# Altium footprint library 20210518.PcbLib: 414 footprints (part 17 of 26)
Each footprint in its own frame and in the unit in brackets; x right, y up, seen from the top. Pads: shape width x height; smd on the part's side, far side on the other; paste and mask are expansions set on the pad; w line width, h text height; cw(c..) or ccw(c..) is an arc to the next point about the centre after c.
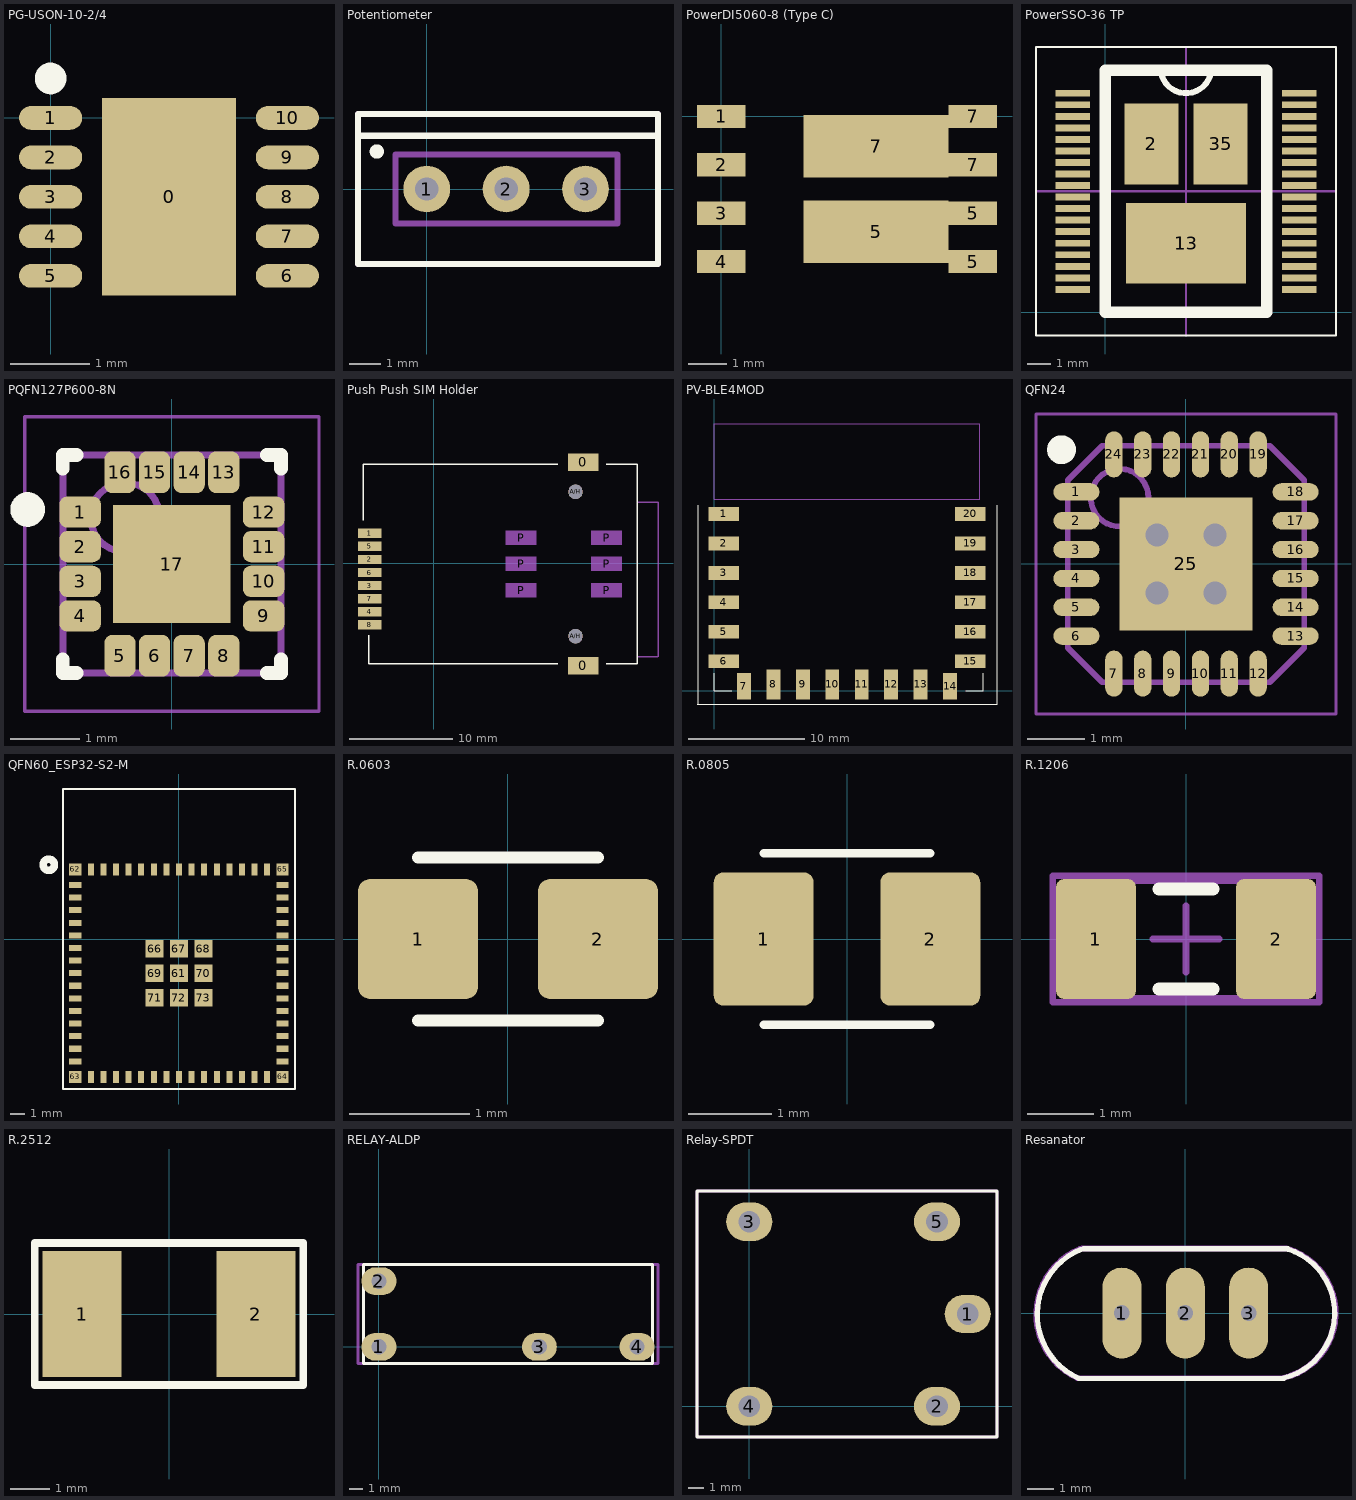
[diagram p16: the footprints below, top view; thin cyan lines are the x and y axes]

## PG-USON-10-2/4 [mm] "PG-USON-10-2,-4 Package Outline"
height 0.6
pads (11):
  rect 1.7x2.5 smd: 0(1.5,-1)
  oval 0.8x0.3 smd: 1(0,0) 2(0,-0.5) 3(0,-1) 4(0,-1.5) 5(0,-2) 6(3,-2) 7(3,-1.5) 8(3,-1) 9(3,-0.5) 10(3,0)
Top Overlay:
  circle w0.2: c0,0.5 r0.1
3D body: height 0.6, standoff 0, extent 0,-2.5 3,0.5

## Potentiometer [mm] "Bourns Potentiometer"
pads (3):
  round 1.5 hole 0.75: 1(0,0) 2(2.54,0) 3(5.08,0)
Top Overlay:
  circle w0.254: c-1.6,1.2 r0.1
  lines w0.2: -2.2,1.7 7.4,1.7 ; -2.2,-2.4 -2.2,2.4 7.4,2.4 7.4,-2.4 -2.2,-2.4
Mechanical 13:
  lines w0.2: -2.2,-2.4 -2.2,2.4 7.4,2.4 7.4,-2.4 -2.2,-2.4
Mechanical 15:
  lines w0.2: -1,-1.1 6.1,-1.1 6.1,1.1 -1,1.1 -1,-1.1
3D body: height 11.55, standoff -6.4, extent -2.3,-2.4 7.23,2.431

## PowerDI5060-8 (Type C) [mm] "6.15*5.15*1mm"
height 1.1
pads (10):
  rect 1.27x0.61 smd: 1(0,0) 2(0,-1.27) 3(0,-2.54) 4(0,-3.81) 5(6.61,-3.81) 5(6.61,-2.54) 7(6.61,-1.27) 7(6.61,0)
  rect 3.81x1.65 smd: 5(4.07,-3.03) 7(4.07,-0.78)

## PowerSSO-36 TP [mm] "ECOPACK"
height 2.5
pads (39):
  rect 1.5x0.3 smd: 1(-1.4,9.5) 2(-1.4,9) 3(-1.4,8.5) 4(-1.4,8) 5(-1.4,7.5) 6(-1.4,7) 7(-1.4,6.5) 8(-1.4,6) 9(-1.4,5.5) 10(-1.4,5) 11(-1.4,4.5) 12(-1.4,4) 13(-1.4,3.5) 14(-1.4,3) 15(-1.4,2.5) 16(-1.4,2) 17(-1.4,1.5) 18(-1.4,1) 19(8.4,1) 20(8.4,1.5) 21(8.4,2) 22(8.4,2.5) 23(8.4,3) 24(8.4,3.5) 25(8.4,4) 26(8.4,4.5) 27(8.4,5) 28(8.4,5.5) 29(8.4,6) 30(8.4,6.5) 31(8.4,7) 32(8.4,7.5) 33(8.4,8) 34(8.4,8.5) 35(8.4,9) 36(8.4,9.5)
  rect 2.35x3.5 smd: 2(2,7.3) 35(5,7.3)
  rect 5.2x3.5 smd: 13(3.5,3)
Top Overlay:
  lines w0.1: -3,-1 -3,11.5 10,11.5 10,-1 -3,-1
  lines w0.254: 2.466,10.224 ccw(c3.5,10.6) 4.534,10.224
  lines w0.5: 0,0 0,10.5 7,10.5 7,0 0,0
Mechanical 13:
  lines w0.1: -3,5.25 10,5.25 ; 3.5,-1 3.5,11.5
3D body: height 2.31, standoff -0.01, extent -1.694,0 8.806,10.5

## PQFN127P600-8N [mm]
height 1
pads (17):
  rrect50% 0.6x0.45 smd: 1(-1.325,0.75) 2(-1.325,0.25) 3(-1.325,-0.25) 4(-1.325,-0.75) 9(1.325,-0.75) 10(1.325,-0.25) 11(1.325,0.25) 12(1.325,0.75)
  rrect50% 0.45x0.6 smd: 5(-0.75,-1.325) 6(-0.25,-1.325) 7(0.25,-1.325) 8(0.75,-1.325) 13(0.75,1.325) 14(0.25,1.325) 15(-0.25,1.325) 16(-0.75,1.325)
  rect 1.7x1.7 smd: 17(0,0)
Top Overlay:
  circle w0.25: c-2.083,0.787 r0.125
  lines w0.2: -1.575,-1.375 -1.575,-1.575 -1.375,-1.575 ; -1.575,1.375 -1.575,1.575 -1.375,1.575 ; 1.375,-1.575 1.575,-1.575 1.575,-1.375 ; 1.375,1.575 1.575,1.575 1.575,1.375
Mechanical 13:
  circle w0.1: c-0.675,0.675 r0.5
  lines w0.1: -1.575,-1.575 1.575,-1.575 1.575,1.575 -1.575,1.575 -1.575,-1.575
Mechanical 15:
  lines w0.05: -2.125,-2.125 2.125,-2.125 2.125,2.125 -2.125,2.125 -2.125,-2.125
  lines w0.1: -0.5,0 0.5,0 ; 0,-0.5 0,0.5
3D body: height 1, standoff 0.2, extent -1.575,-1.575 1.575,1.575

## Push Push SIM Holder [mm] "Attend Push Push Type SIM Holder"
pads (18):
  rect 3x1.7 smd: 0(14.479,-9.9) 0(14.479,9.8)
  rect 2.3x0.9 smd: 1(-6.221,2.935) 2(-6.221,0.395) 3(-6.221,-2.145) 4(-6.221,-4.685) 5(-6.221,1.665) 6(-6.221,-0.875) 7(-6.221,-3.415) 8(-6.221,-5.955)
  round 1.4 hole 1.4 unplated: A/H(13.729,-7.05) A/H(13.729,6.95)
  rect 3x1.4 on Mech15: P(8.449,-2.58) P(8.449,-0.04) P(8.449,2.5) P(16.749,-2.58) P(16.749,-0.04) P(16.749,2.5)
Top Overlay:
  lines w0.127: -6.858,4.191 -6.858,9.625 12.002,9.625 ; -6.346,-6.944 -6.346,-9.725 12.002,-9.725 ; 16.721,-9.725 19.729,-9.725 19.729,9.625 16.721,9.625
Mechanical 15:
  lines w0.127: 19.729,5.954 21.729,5.954 21.729,-9.046 ; 19.74,-9.046 21.727,-9.046
3D body: height 1.8, standoff -0.03, extent -6.9,-10.541 19.6,10.409
3D body: height 1.55, standoff 0.79, extent -4.521,-9.176 21.539,5.824

## PV-BLE4MOD [mm]
pads (20):
  rect 2.6x1.2 smd: 1(0.8,15.24) 2(0.8,12.7) 3(0.8,10.16) 4(0.8,7.62) 5(0.8,5.08) 6(0.8,2.54) 15(22.06,2.54) 16(22.06,5.08) 17(22.06,7.62) 18(22.06,10.16) 19(22.06,12.7) 20(22.06,15.24)
  rect 1.2x2.3 smd: 7(2.54,0.39) 14(20.32,0.39)
  rect 1.2x2.6 smd: 8(5.08,0.54) 9(7.62,0.54) 10(10.16,0.54) 11(12.7,0.54) 12(15.24,0.54) 13(17.78,0.54)
Top Overlay:
  lines w0.1: -1.5,-1.16 24.36,-1.16 24.36,16 ; -1.4,-1.16 -1.4,16 ; 0,1.5 0,0 1.5,0 ; 21.66,0 23.16,0 23.16,1.5
Mechanical 15:
  lines w0.1: 0,16.5 0,23 22.86,23 22.86,16.5 0,16.5
  text "NO VIA" at 14.28,21.76 h3
  text "NO METAL" at 15.986,18.93 h3
3D body: height 1.51, standoff 1.5, extent 0.55,16.6 22.31,16.85
3D body: height 1.51, standoff 1.5, extent 0.55,16.85 0.8,22.65
3D body: height 1.51, standoff 1.5, extent 0.55,22.65 22.1,22.9
3D body: height 1.51, standoff 1.5, extent 21.85,17.2 22.1,22.65
3D body: height 1.51, standoff 1.5, extent 2.85,17.2 21.85,17.45
3D body: height 1.51, standoff 1.5, extent 2.85,17.45 3.1,21.64
3D body: height 1.51, standoff 1.5, extent 3.1,21.39 20.57,21.64
3D body: height 1.51, standoff 1.5, extent 20.32,18.27 20.57,21.39
3D body: height 1.51, standoff 1.5, extent 5.44,18.27 20.32,18.52
3D body: height 1.5, standoff 0, extent 0.43,0 22.43,23

## QFN24 [mm] "QFN, 24-Leads, Body 4,00x4,00mm, Pitch 0,50mm, Thermal Pad 2,50x2,50mm, IPC Medium Density"
height 0.7
pads (25):
  oval 0.8x0.3 smd: 1(-1.9,1.25) 2(-1.9,0.75) 3(-1.9,0.25) 4(-1.9,-0.25) 5(-1.9,-0.75) 6(-1.9,-1.25) 13(1.9,-1.25) 14(1.9,-0.75) 15(1.9,-0.25) 16(1.9,0.25) 17(1.9,0.75) 18(1.9,1.25)
  oval 0.3x0.8 smd: 7(-1.25,-1.9) 8(-0.75,-1.9) 9(-0.25,-1.9) 10(0.25,-1.9) 11(0.75,-1.9) 12(1.25,-1.9) 19(1.25,1.9) 20(0.75,1.9) 21(0.25,1.9) 22(-0.25,1.9) 23(-0.75,1.9) 24(-1.25,1.9)
  rect 2.3x2.3 smd: 25(0,0)
via -0.5,0.5 diameter 0.8 hole 0.4
via 0.5,0.5 diameter 0.8 hole 0.4
via -0.5,-0.5 diameter 0.8 hole 0.4
via 0.5,-0.5 diameter 0.8 hole 0.4
Top Overlay:
  circle w0.25: c-2.159,1.981 r0.125
Mechanical 13:
  circle w0.1: c-1.15,1.15 r0.5
  lines w0.1: -2.05,-1.45 -1.45,-2.05 1.45,-2.05 2.05,-1.45 2.05,1.45 1.45,2.05 -1.45,2.05 -2.05,1.45 -2.05,-1.45
Mechanical 15:
  lines w0.05: -2.6,-2.6 -2.6,2.6 2.6,2.6 2.6,-2.6 -2.6,-2.6
  lines w0.1: -0.5,0 0.5,0 ; 0,-0.5 0,0.5
3D body: height 1, standoff 0, extent -2.01,-2.01 2.01,2.01

## QFN60_ESP32-S2-M [mil]
pads (73):
  rect 32x16 smd: 1(-275.59,143.5) 2(-275.59,110.04) 3(-275.59,76.57) 4(-275.59,43.11) 5(-275.59,9.64) 6(-275.59,-23.82) 7(-275.59,-57.29) 8(-275.59,-90.75) 9(-275.59,-124.22) 10(-275.59,-157.68) 11(-275.59,-191.15) 12(-275.59,-224.61) 13(-275.59,-258.07) 14(-275.59,-291.54) 15(-275.59,-325) 31(275.59,-325) 32(275.59,-291.54) 33(275.59,-258.07) 34(275.59,-224.61) 35(275.59,-191.15) 36(275.59,-157.68) 37(275.59,-124.22) 38(275.59,-90.75) 39(275.59,-57.29) 40(275.59,-23.82) 41(275.59,9.64) 42(275.59,43.11) 43(275.59,76.57) 44(275.59,110.04) 45(275.59,143.5)
  rect 16x32 smd: 16(-234.25,-366.34) 17(-200.79,-366.34) 18(-167.32,-366.34) 19(-133.86,-366.34) 20(-100.39,-366.34) 21(-66.93,-366.34) 22(-33.46,-366.34) 23(0,-366.34) 24(33.46,-366.34) 25(66.93,-366.34) 26(100.39,-366.34) 27(133.86,-366.34) 28(167.32,-366.34) 29(200.79,-366.34) 30(234.25,-366.34) 46(234.25,184.84) 47(200.79,184.84) 48(167.32,184.84) 49(133.86,184.84) 50(100.39,184.84) 51(66.93,184.84) 52(33.46,184.84) 53(0,184.84) 54(-33.46,184.84) 55(-66.93,184.84) 56(-100.39,184.84) 57(-133.86,184.84) 58(-167.32,184.84) 59(-200.79,184.84) 60(-234.25,184.84)
  rect 47x47 smd: 61(0,-90.75) 66(-64.96,-25.79) 67(0,-25.79) 68(64.96,-25.79) 69(-64.96,-90.75) 70(64.96,-90.75) 71(-64.96,-155.71) 72(0,-155.71) 73(64.96,-155.71)
  rect 32x32 smd: 62(-275.59,184.84) 63(-275.59,-366.34) 64(275.59,-366.34) 65(275.59,184.84)
Top Overlay:
  circle w20: c-346.06,197.24 r15
  lines w6: -308,-398.5 -308,398.5 308,398.5 308,-398.5 -308,-398.5
Dimensions:
  text "ANTENNA" at -241.22,274.33 h70
3D body: height 100.39, standoff 0, extent -303.15,-394 303.15,393.4

## R.0603 [mm] "Chip Resistor, Body 1.6x0.8mm, IPC High Density"
height 0.45
pads (2):
  rrect20% 1x1 smd: 1(-0.75,0) 2(0.75,0)
Top Overlay:
  lines w0.1: -0.75,-0.68 0.75,-0.68 ; -0.75,0.68 0.75,0.68
3D body: height 0.3, standoff 0, extent -0.8,-0.4 0.8,0.4

## R.0805 [mm] "Chip Resistor, Body 2.0x1.3mm, IPC High Density"
height 0.55
pads (2):
  rrect20% 1.2x1.6 smd: 1(-1,0) 2(1,0)
Top Overlay:
  lines w0.1: -1,-1.03 1,-1.03 ; -1,1.03 1,1.03
3D body: height 0.79, standoff 0, extent -1.254,-0.622 1.254,0.622

## R.1206 [mm] "Chip Resistor, Body 3.1x1.6mm, IPC High Density"
height 0.55
pads (2):
  rrect20% 1.2x1.8 smd: 1(-1.35,0) 2(1.35,0)
Top Overlay:
  lines w0.2: -0.4,-0.75 0.4,-0.75 ; -0.4,0.75 0.4,0.75
Mechanical 13:
  lines w0.1: -1.675,-0.889 1.675,-0.889 1.675,0.875 -1.675,0.875 -1.675,-0.889
Mechanical 15:
  lines w0.1: -0.5,0 0.5,0 ; 0,-0.5 0,0.5 ; -2,-0.95 2,-0.95 2,0.95 -2,0.95 -2,-0.95
3D body: height 1, standoff 0, extent -1.6,-0.8 1.6,0.8

## R.2512 [mm]
pads (2):
  rect 2x3.2 smd: 1(-2.2,0) 2(2.2,0)
Top Overlay:
  lines w0.2: -3.4,-1.8 3.4,-1.8 3.4,1.8 -3.4,1.8 -3.4,-1.8
3D body: height 0.55, standoff 0, extent -3.37,-1.61 3.33,1.59

## RELAY-ALDP [mm]
pads (4):
  oval 2.5x2 hole 1.1: 1(0,0) 2(0,4.7) 3(11.5,0) 4(18.5,0)
Top Overlay:
  lines w0.2: -1.1,-1.2 19.6,-1.2 19.6,5.9 -1.1,5.9 -1.1,-1.2
Mechanical 15:
  lines w0.2: -1.5,-1.2 -1.5,5.9 20,5.9 20,-1.2 -1.5,-1.2
3D body: height 15.3, standoff -3.4, extent -1,-1.3 19.5,5.9

## Relay-SPDT [mm]
pads (5):
  oval 3x2.5 hole 1.4: 1(14.2,6) 2(12.2,0) 3(0,12) 4(0,0) 5(12.2,12)
Top Overlay:
  lines w0.2: -3.4,-2 16.1,-2 16.1,14 -3.4,14 -3.4,-2
Mechanical 15:
  lines w0.2: -3.4,-2 -3.4,14 16.1,14 16.1,-2 -3.4,-2
3D body: height 15, standoff -5, extent -3.5,-1.7 15.7,13.7

## Resanator [mm] "Standart Radial, 3 pin, 4.88mm pin space, 0.6mm Hole, Body 11.5x5mm, 3.68 height"
height 3.68
pads (3):
  oval 1.5x3.5 hole 0.6: 1(-2.44,0) 2(0,0) 3(2.44,0)
Top Overlay:
  lines w0.2: -4.116,-2.509 cw(c-3,-0.05) -4.02,2.45 ; -4.1,-2.525 3.8,-2.525 ; -3.925,2.475 3.95,2.475 ; 3.777,-2.508 ccw(c3.175,0) 3.953,2.459
Mechanical 13:
  lines w0.2: -4.166,-2.484 cw(c-3.05,-0.025) -4.07,2.475 ; -4.15,-2.5 3.75,-2.5 ; -3.975,2.5 3.9,2.5 ; 3.777,-2.483 ccw(c3.175,0.025) 3.953,2.484
Mechanical 15:
  lines w0.2: -4.166,-2.509 cw(c-3.05,-0.05) -4.07,2.45 ; -4.15,-2.525 3.75,-2.525 ; -3.975,2.475 3.9,2.475 ; 3.827,-2.508 ccw(c3.225,0) 4.003,2.459
3D body: height 3, standoff 0, extent -3.87,-7.6 3.87,1.4